# Altium integrated library all_in_one_library.IntLib: 677 symbols (part 2 of 3)
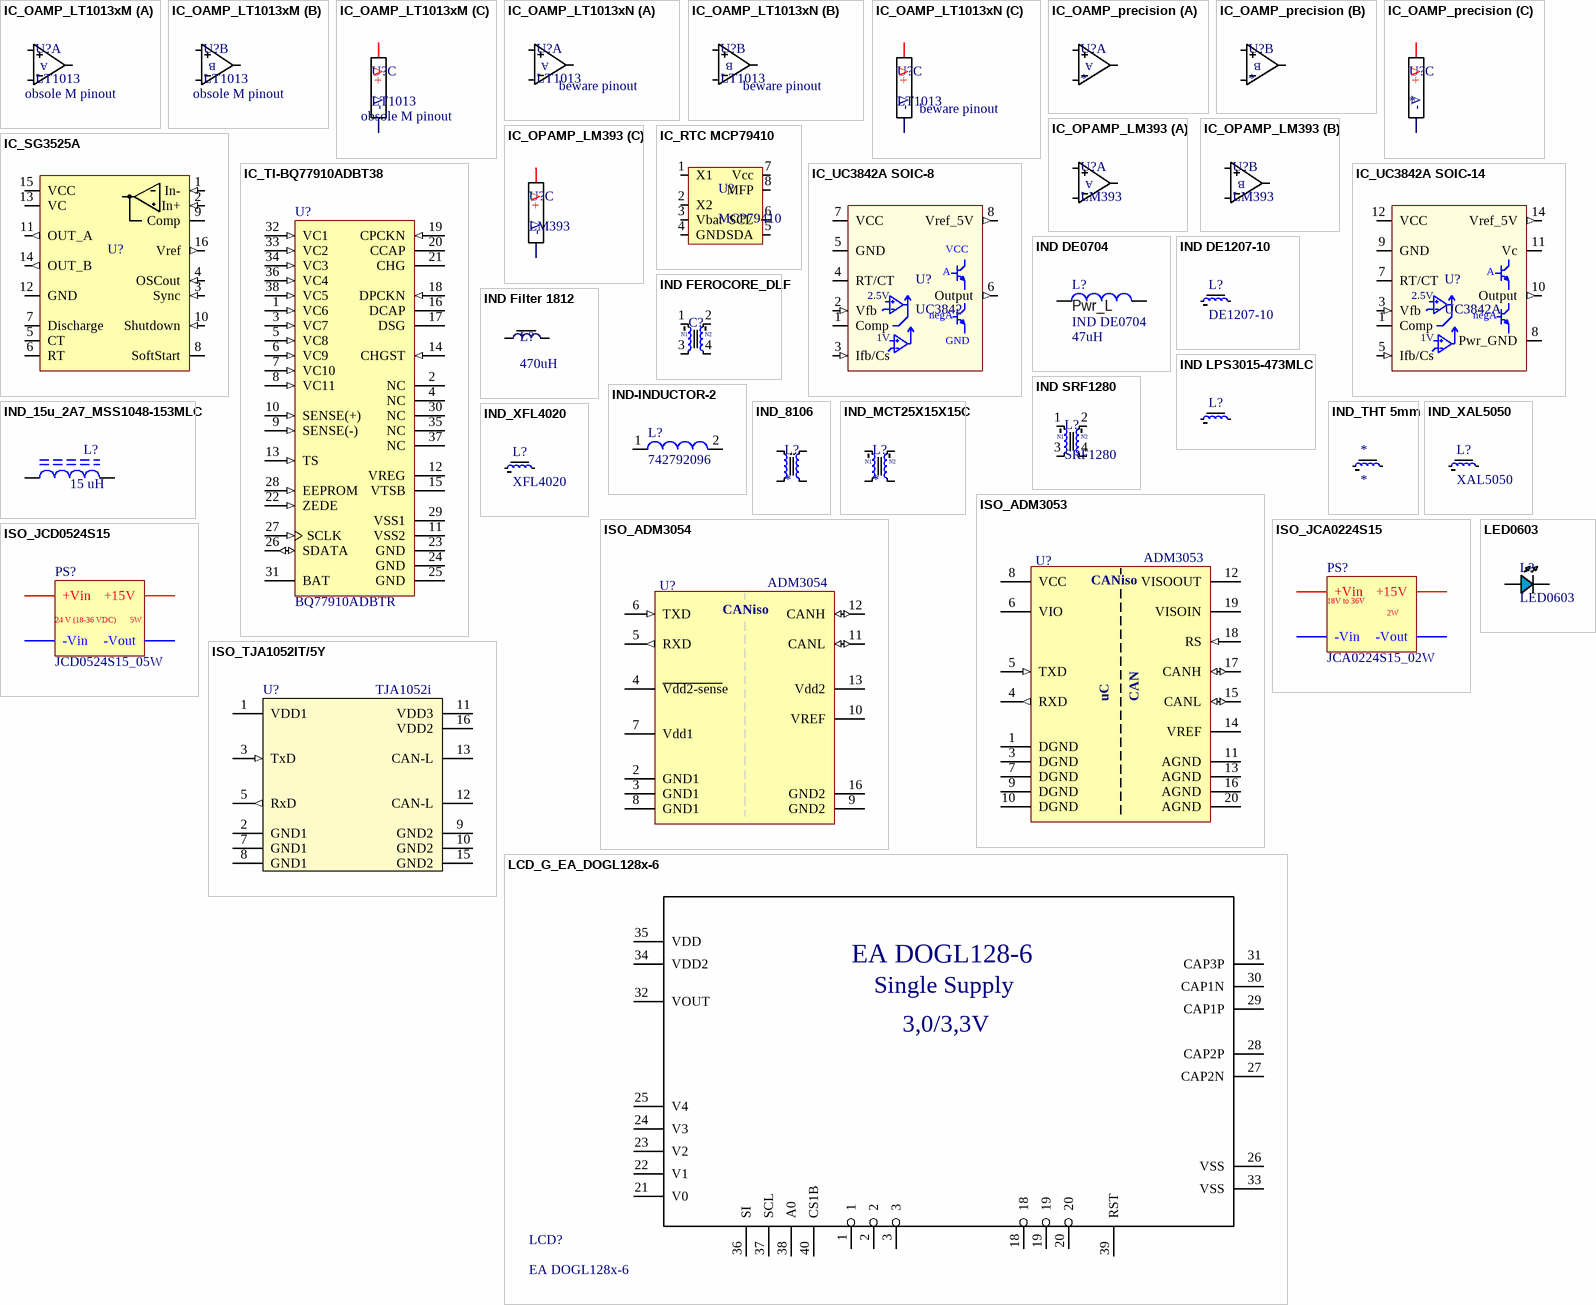
[diagram p18: symbols IC_OAMP_LT1013xM to LED0603]

## IND DE1207-10
designator L?, comment DE1207-10
Inductor: wire; 10uH; 6.7A; 0.019?; SMD; 12x12x8mm; �20%; -40A?85�C; Manufacturer: FERROCORE; Unit: pcs; SuppliedAmount: 500; MinAmount: 5; Multiples: 1; Inductance: 10�H; Supplier 1: TME; Manufacturer Part Number: DE1207-10; Category: smd power inductors; Stock 1: 1839; Pricing 1: 5=0,438, 25=0,373, 100=0,34, 250=0,289, 500=0,256 (USD); Weight: 4,893; Inductor type: wire; Operating current: 6.7A; Resistance: 0.019?; Mounting: SMD; Body dimensions: 12 x 12 x 8mm; Tolerance: �20%; Operating temperature: -40...85�C; ComponentLink1URL: http://www.tme.eu/en/details/de1207-10/smd-power-inductors/ferrocore/; ComponentLink1Description: http://www.tme.eu/en/details/de1207-10/smd-power-inductors/ferrocore/; Supplier Part Number 1: DE1207-10
footprint IND DE1207
pins: 1, 2

## IND FEROCORE_DLF
designator C?  (value not drawn)
footprint FEROCORE_DLF
pins: 1, 2, 3, 4
text: N1; N2

## IND Filter 1812
designator L?, comment 470uH
Filter 470uH - 10mH; Suplier: Farnell; Alias: 1812LS xx; Producer: Coilcraft; Link: http://cz.farnell.com/jsp/search/browse.jsp?N=224775+2007+110178564+110127172+110148617+110188935+110172601+110186245+110197766+110166166+110192877&No=0&getResults=true&appliedparametrics=true&locale=cs_CZ&divisionLocale=cs_CZ&catalogId=&skipManufacturer=false&skipParametricAttributeId=&prevNValues=224775+2007&mm=1001698|110127172|,&filtersHidden=false&appliedHidden=false&autoApply=false&originalQueryURL=%2Fjsp%2Fsearch%2Fbrowse.jsp%3FN%3D224775%2B2007%26No%3D0%26getResults%3Dtrue%26appliedparametrics%3Dtrue%26locale%3Dcs_CZ%26divisionLocale%3Dcs_CZ%26catalogId%3D%26skipManufacturer%3Dfalse%26skipParametricAttributeId%3D%26prevNValues%3D224775%2B2007
footprint IND_1812
pins: 1, 2

## IND LPS3015-473MLC
designator L?, comment LPS3015-473MLC  (value not drawn)
INDUCTOR, PWR, 47UH, 0.4A, 20%,17MHZ; Link: http://cz.farnell.com/coilcraft/lps3015-473mlc/inductor-pwr-47uh-0-4a-20-17mhz/dp/2287606
footprint COILCRAFT_LPS3015
pins: 1, 2

## IND SRF1280
designator L?, comment SRF1280
dual choke SRF1280; Suplier: Farnell; Alias: SRF1280; Datasheet: http://www.farnell.com/datasheets/1727960.pdf
footprint SRF1280
pins: 1, 2, 3, 4
text: N1; N2

## IND-INDUCTOR-2
designator L?, comment 742792096
SMD EMI Suppression Ferrite Bead WE-CBF, Z = 1000 Ohm; ComponentLink1URL: http://www.we-online.com; Impedance: 1000 Ohm; PackageDescription: Chip Inductor, 2-Leads, Body 2.0 x 1.2 mm; PackageReference: SMD-0805; ComponentLink1Description: Manufacturer Link; DatasheetVersion: Dec-2005; ComponentLink2Description: Datasheet; PackageVersion: 2005; ComponentLink2URL: http://www.we-online.de/katalog/media/pdf/742792096.pdf
footprint BEAD-0805
pins: 1, 2

## IND_15u_2A7_MSS1048-153MLC
designator L?, comment value 15 uH  (hidden comment: Inductor)
I_RMS@20°C rise: 3.51 A; I_SAT@20% drop: 3.06 A; R_DC: 0.0364 Ω; Tolerance: ±20%; SRF: 20 MHz; I_SAT@10% drop: 2.46 A; I_SAT@30% drop: 3.44 A; I_RMS@40°C rise: 4.26 A
footprint MSS1048_coilcraft (inductors)
pins: 1, 2
1 alternate drawing of the same symbol

## IND_8106
designator L?
dual choke 5mH 3.7A _8106; Alias: BOURNS JW MILLER - 8106-RC - CHOKE, 5MH, 3.7A
footprint 8106-RC (dual choke 5MH, 3.7A)
pins: 1, 2, 3, 4

## IND_MCT25X15X15C
designator L?
dual choke 5mH 6A MCT25X15X15C; Alias: MCT25X15X15C
footprint MCT25X15X15C
pins: 1, 2, 3, 4
text: N1; N2

## IND_THT 5mm
designator *
footprint Inductor 5mm
pins: 1, 2

## IND_XAL5050
designator L?, comment XAL5050
5.6u-47uH power ind by coilcraft; Link: http://cz.farnell.com/jsp/search/browse.jsp;jsessionid=5LXFQKZMXRVEYCQLCIRJOXQ?N=0&Ntk=gensearch&Ntt=XAL5050&Ntx=mode+matchallpartial&exposeLevel2Refinement=true&suggestions=false&ref=globalsearch&_requestid=82792
footprint IND_XAL5050
pins: 1, 2

## IND_XFL4020
designator L?, comment XFL4020
1u-4.7uH power ind by coilcraft; Link: http://cz.farnell.com/jsp/search/browse.jsp?N=2007+216045&Ntk=gensearch&Ntt=XFL4020&Ntx=mode+matchallpartial
footprint IND_XFL4020
pins: 1, 2

## ISO_ADM3053
designator U?, comment ADM3053
DCDC CAN Transciever
footprint SOIC20_W
pins: 1 DGND (power), 3 DGND (power), 4 RXD (out), 5 TXD (in), 6 VIO (power), 7 DGND (power), 8 VCC (power), 9 DGND (power), 10 DGND (power), 11 AGND (power), 12 VISOOUT (power), 13 AGND (power), 14 VREF (power), 15 CANL (io), 16 AGND (power), 17 CANH (io), 18 RS (in), 19 VISOIN (power), 20 AGND (power)
text: CANiso; uC; CAN

## ISO_ADM3054
designator U?, comment ADM3054
CAN Transciever ISO-5kV; link: http://cz.farnell.com/analog-devices/adm3054brwz/can-transceiver-1tx-rx-wsoic-16/dp/2377146; datasheet: http://www.analog.com/media/en/technical-documentation/data-sheets/ADM3054.pdf
footprint SOIC16_W
pins: 2 GND1 (power), 3 GND1 (power), 4 ~{Vdd2-sens}e (power), 5 RXD (out), 6 TXD (in), 7 Vdd1 (power), 8 GND1 (power), 9 GND2 (power), 10 VREF (power), 11 CANL (io), 12 CANH (io), 13 Vdd2 (power), 16 GND2 (power)
text: CANiso

## ISO_JCA0224S15
designator PS?, comment JCA0224S15_02W
XP POWER - JCA0224S15 - CONVERTER, DC/DC, 1O/P, 2W, 15V
footprint JCA0224S15
pins: +Vin (power), +Vout +15V (power), -Vin (power), -Vout (power)
text: 18V to 36V; 2W

## ISO_JCD0524S15
designator PS?, comment JCD0524S15_05W
XP POWER - JCD0524S15 - DC/DC CONVERTER, 5W, 15V, DIP-24
footprint JCD0524S15_05W
pins: +Vin (power), +Vout +15V (power), -Vin (power), -Vout (power)
text: 24 V (18-36 VDC); 5W

## ISO_TJA1052IT/5Y
designator U?, comment TJA1052i
can isolator 3.3-5V; link: http://cz.farnell.com/nxp/tja1052it-5y/can-transceiver-1tx-rx-soic-16/dp/2400552?ost=TJA1052i
footprint SOIC_16o
pins: 1 VDD1 (power), 2 GND1 (power), 3 TxD (in), 5 RxD (out), 7 GND1 (power), 8 GND1 (power), 9 GND2 (power), 10 GND2 (power), 11 VDD3 (power), 12 CAN-L, 13 CAN-L, 15 GND2 (power), 16 VDD2 (power)

## LCD_G_EA_DOGL128x-6
designator LCD?, comment EA DOGL128x-6
footprint LCDG_EA_DOGL128x-6
pins: 1 "(ARGB)", 2, 3, 18, 19, 20, 21 V0, 22 V1, 23 V2, 24 V3, 25 V4, 26 VSS, 27 CAP2N, 28 CAP2P, 29 CAP1P, 30 CAP1N, 31 CAP3P, 32 VOUT, 33 VSS, 34 VDD2, 35 VDD, 36 SI, 37 SCL, 38 A0, 39 RST, 40 CS1B
text: EA DOGL128-6; Single Supply; 3,0/3,3V

## LED0603
designator L?
footprint LED0603
pins: A, K

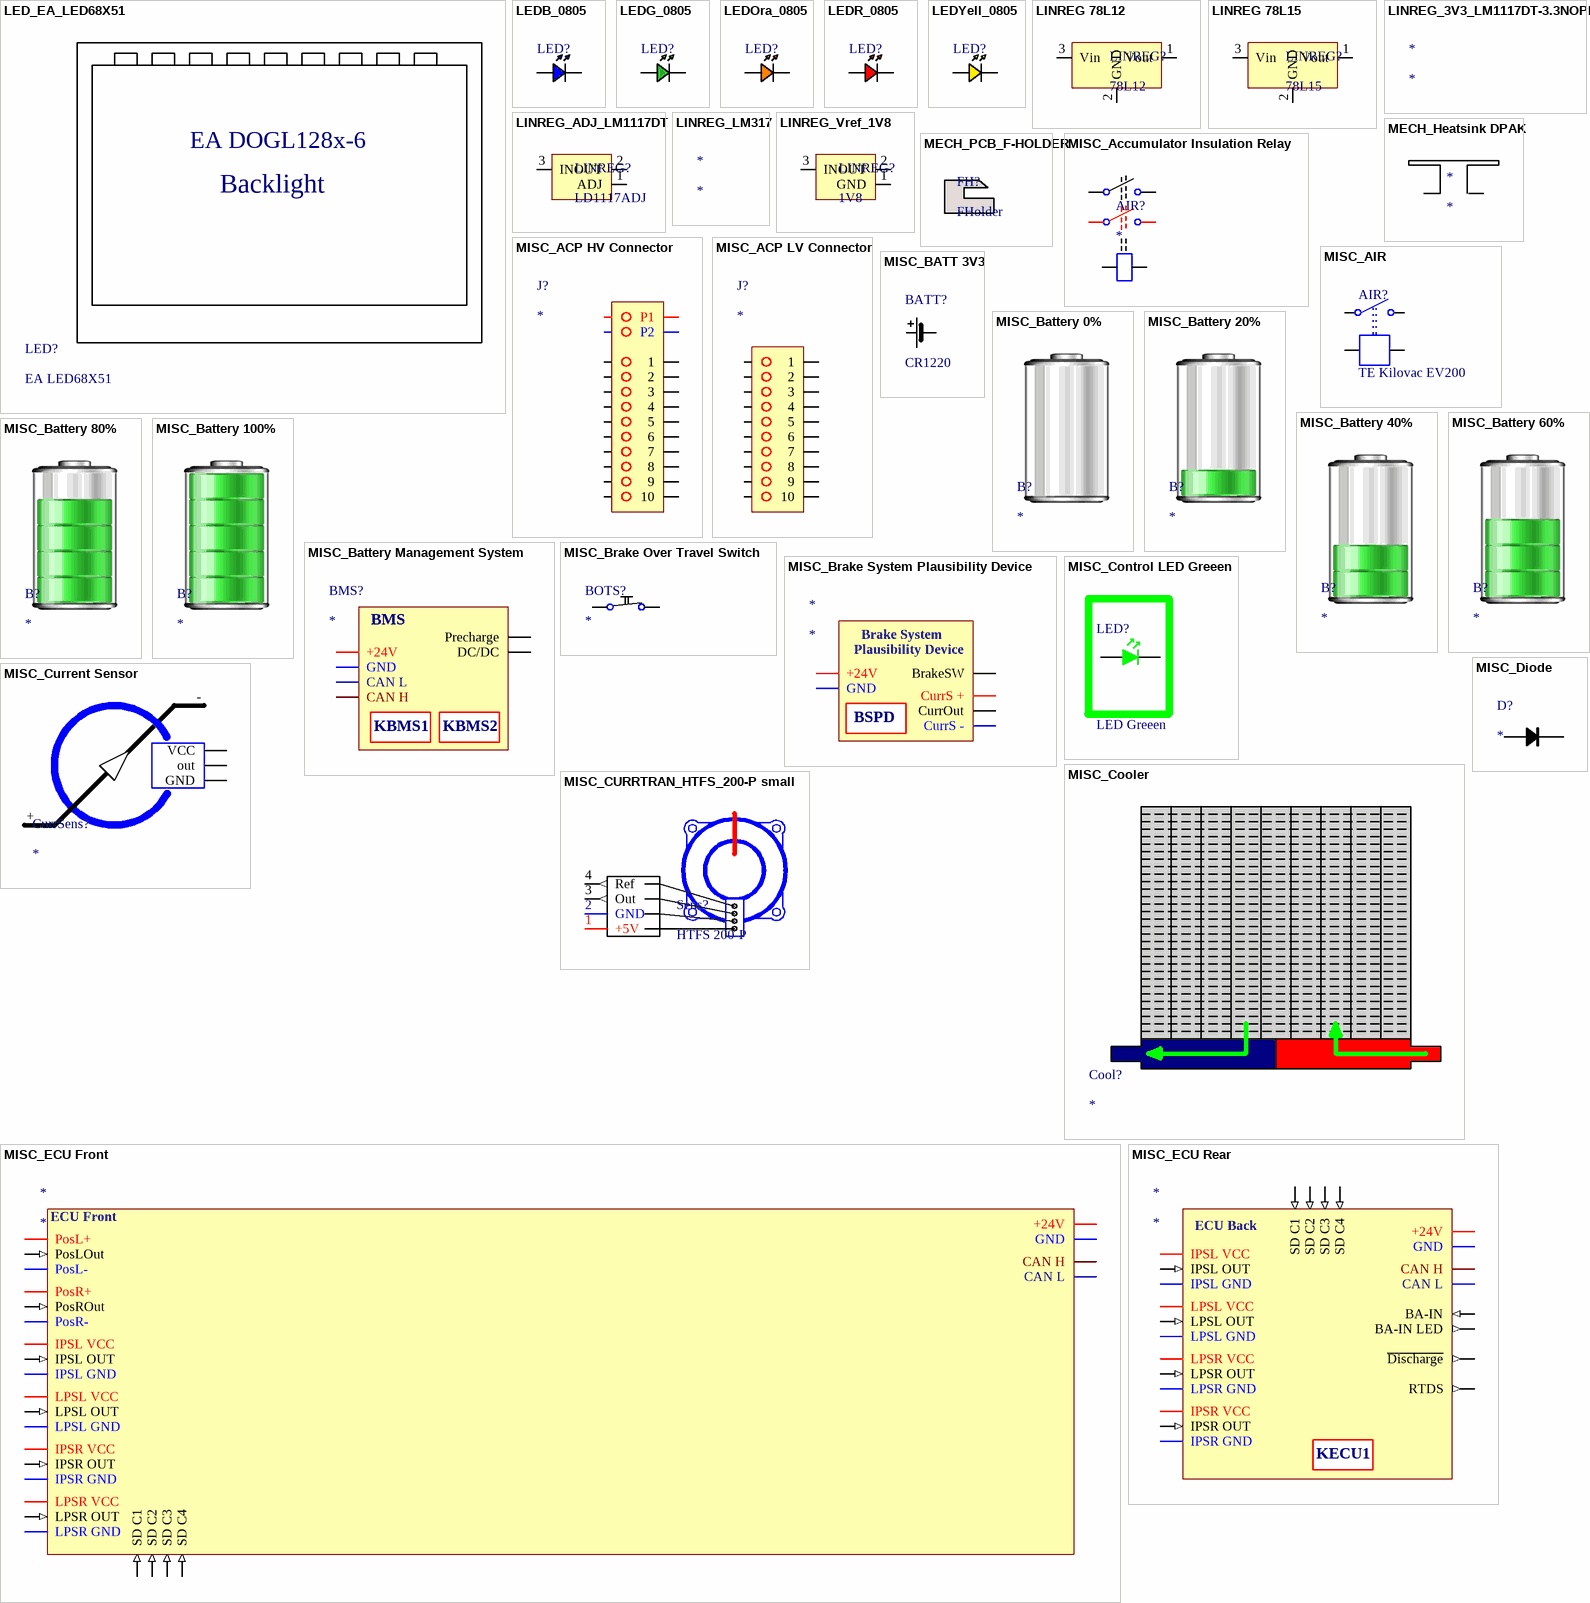
[diagram p6: symbols LED_EA_LED68X51 to MISC_ECU Rear]

## LED_EA_LED68X51
designator LED?, comment EA LED68X51
text: EA DOGL128x-6; Backlight

## LEDB_0805
designator LED?, comment blue  (value not drawn)
footprint 0805LEDB
pins: A, K

## LEDG_0805
designator LED?, comment green  (value not drawn)
footprint 0805LEDG
pins: A, K

## LEDOra_0805
designator LED?, comment orange  (value not drawn)
footprint 0805LEDOra
pins: A, K

## LEDR_0805
designator LED?, comment red  (value not drawn)
footprint 0805LEDR
pins: A, K

## LEDYell_0805
designator LED?, comment yellow  (value not drawn)
footprint 0805LEDYell
pins: A, K

## LINREG 78L12
designator LINREG?, comment 78L12
12V linear regulator
footprint TO92
pins: 1 Vout, 2 GND, 3 Vin

## LINREG 78L15
designator LINREG?, comment 78L15
15V linear regulator
footprint TO92
pins: 1 Vout, 2 GND, 3 Vin

## LINREG_3V3_LM1117DT-3.3NOPB
designator *

## LINREG_ADJ_LM1117DT
designator LINREG?, comment LD1117ADJ
15V 1A Adjustable low drop voltage regulator
footprint SOT223
footprint D-PAK
pins: 1 ADJ, 2 OUT, 3 IN

## LINREG_LM317
designator *

## LINREG_Vref_1V8
designator LINREG?, comment 1V8
1.8V Voltage reference; Alias: MCP1700; Suplier: Farnell
footprint SOT23m
pins: 1 GND, 2 OUT, 3 IN

## MECH_Heatsink DPAK
designator *
footprint DPAK_heatsink_SMD
pins: 0, 1

## MECH_PCB_F-HOLDER
designator FH?, comment FHolder
F-HOLDER_16-18-020; top-length: 16mm; bot-length: 18mm; width: 1mm
footprint FHOLDER1618020

## MISC_Accumulator Insulation Relay
designator AIR?
pins: 1, 2, 3, 4, 5, 6

## MISC_ACP HV Connector
designator J?
pins: 1, 1, 2, 2, 3, 3, 4, 4, 5, 5, 6, 6, 7, 7, 8, 8, 9, 9, 10, 10, P1, P1, P2, P2

## MISC_ACP LV Connector
designator J?
pins: 1, 1, 2, 2, 3, 3, 4, 4, 5, 5, 6, 6, 7, 7, 8, 8, 9, 9, 10, 10

## MISC_AIR
designator AIR?, comment TE Kilovac EV200
AIR
pins: 7, 8, A1 1, A2 10
1 alternate drawing of the same symbol

## MISC_BATT 3V3
designator BATT?, comment CR1220
footprint CR1220
pins: 1, 2

## MISC_Battery 0%
designator B?

## MISC_Battery 20%
designator B?

## MISC_Battery 40%
designator B?

## MISC_Battery 60%
designator B?

## MISC_Battery 80%
designator B?

## MISC_Battery 100%
designator B?

## MISC_Battery Management System
designator BMS?
pins: 10 +24V, 11 GND, 12 CAN L, 13 CAN H, 14 Precharge, 16 DC/DC
text: BMS; KBMS1; KBMS2

## MISC_Brake Over Travel Switch
designator BOTS?
pins: 4, 5
1 alternate drawing of the same symbol

## MISC_Brake System Plausibility Device
designator *
pins: +24V, BrakeSW, CurrOut, CurrS +, CurrS -, GND
text: Brake System; Plausibility Device; BSPD

## MISC_Control LED Greeen
designator LED?, comment LED Greeen
pins: 1 LED1, 2 LED2

## MISC_Cooler
designator Cool?
Cooler

## MISC_Current Sensor
designator CurrSens?
pins: +, -, GND, out, VCC

## MISC_CURRTRAN_HTFS_200-P small
designator Sens?, comment HTFS 200-P
footprint CURRTRAN_LEM_HTFS
pins: 1 +5V (power), 2 GND (power), 3 Out (out), 4 Ref (out)
1 alternate drawing of the same symbol

## MISC_Diode
designator D?
pins: A, K

## MISC_ECU Front
designator *
pins: 1 PosL+, 2 PosLOut (in), 3 PosL-, 4 PosR+, 5 PosROut (in), 6 PosR-, 12 CAN L, 13 CAN H, +24V, GND, IPSL GND, IPSL OUT (in), IPSL VCC, IPSR GND, IPSR OUT (in), IPSR VCC, LPSL GND, LPSL OUT (in), LPSL VCC, LPSR GND, LPSR OUT (in), LPSR VCC, SD C1 (in), SD C2 (in), SD C3 (in), SD C4 (in)
text: ECU Front

## MISC_ECU Rear
designator *
pins: 12 CAN L, 13 CAN H, +24V, BA-IN (in), BA-IN LED (out), Discharge ~{Discharge} (out), GND, IPSL GND, IPSL OUT (in), IPSL VCC, IPSR GND, IPSR OUT (in), IPSR VCC, LPSL GND, LPSL OUT (in), LPSL VCC, LPSR GND, LPSR OUT (in), LPSR VCC, RTDS (out), SD C1 (in), SD C2 (in), SD C3 (in), SD C4 (in)
text: ECU Back; KECU1

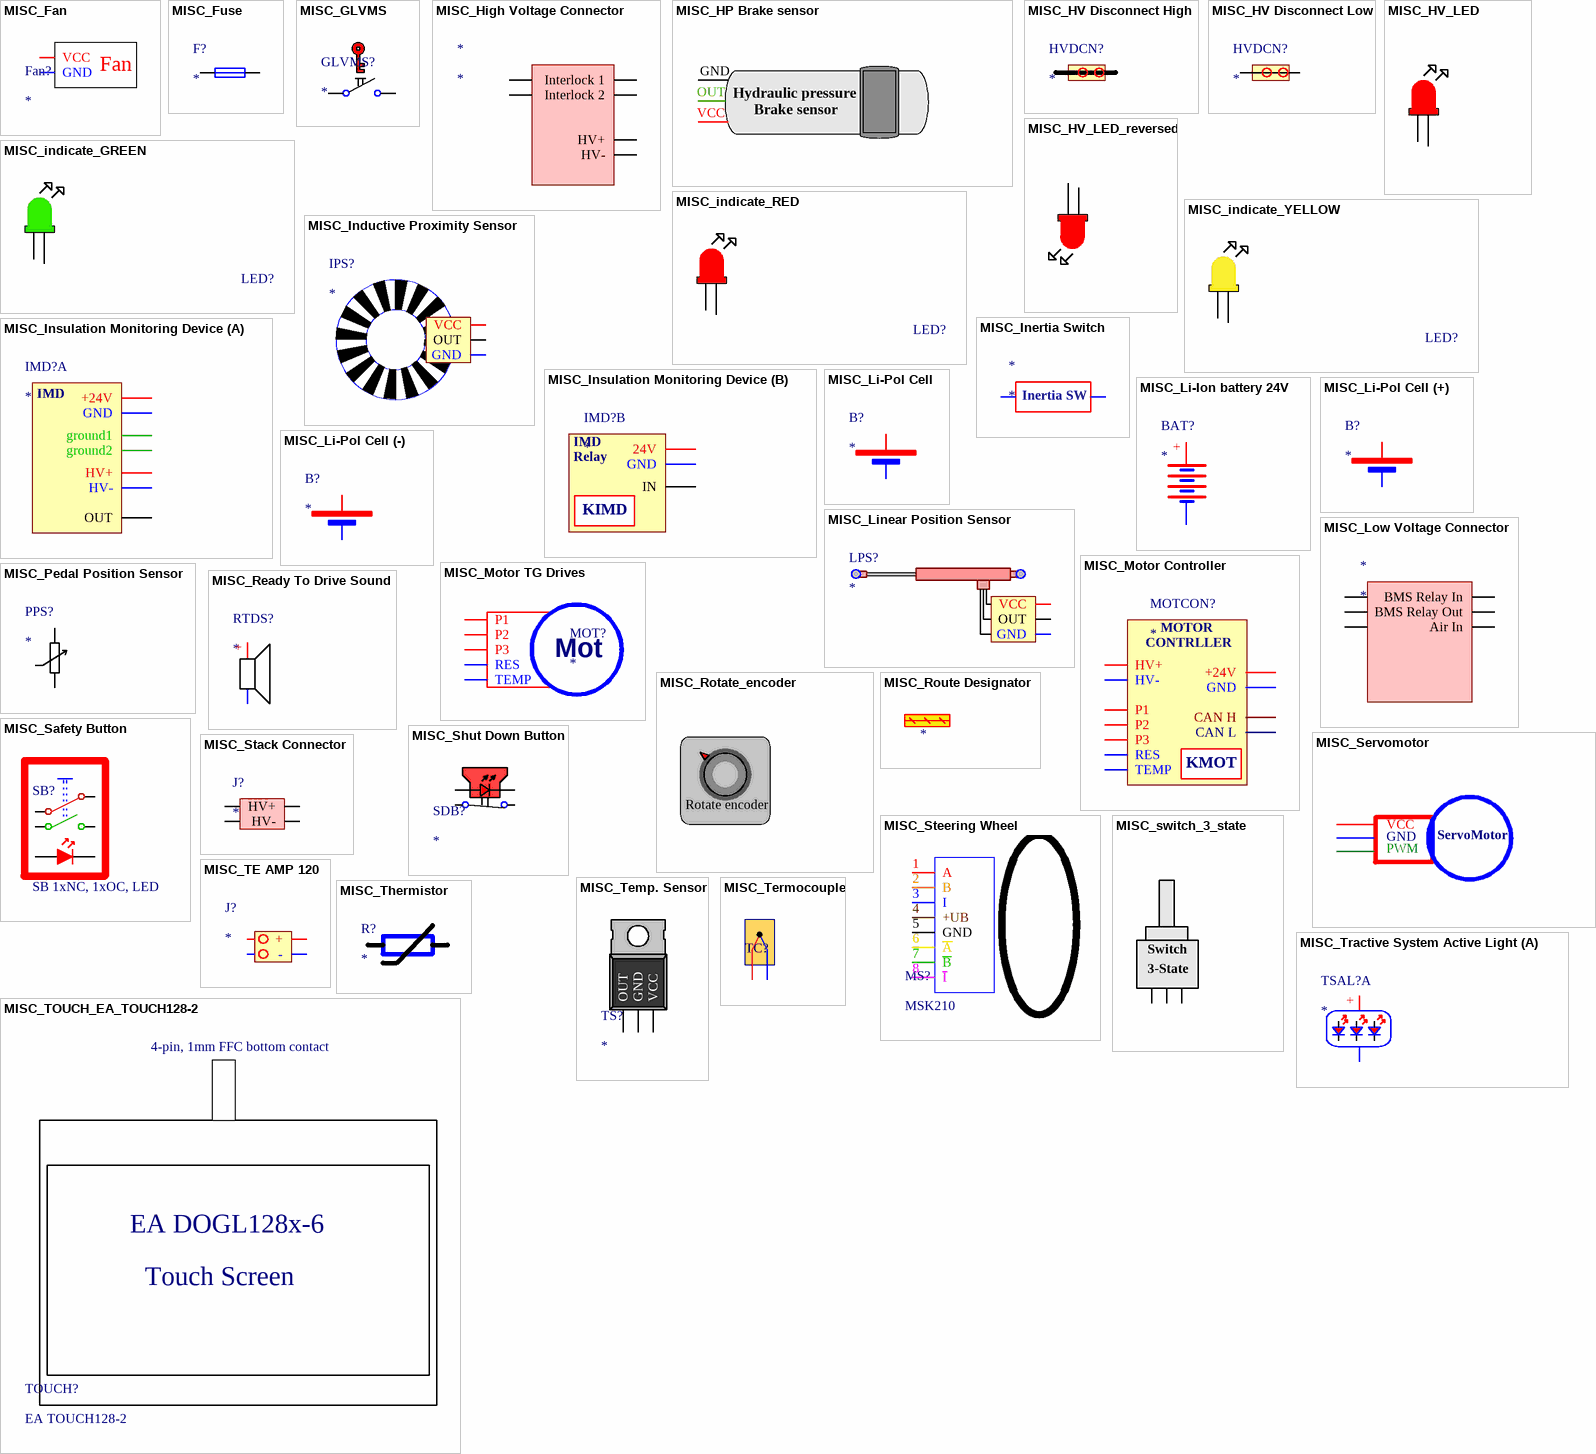
[diagram p7: symbols MISC_Fan to MISC_Tractive System Active Light]

## MISC_Fan
designator Fan?
Ventilátor
pins: 1 GND, 2 VCC
1 alternate drawing of the same symbol
text: Fan

## MISC_Fuse
designator F?
pins: 1, 2

## MISC_GLVMS
designator GLVMS?
Grounded Low Voltage Master Switch
pins: 4, 5
1 alternate drawing of the same symbol

## MISC_High Voltage Connector
designator *
pins: HV+, HV- Interlock 1, HV- Interlock 2, HV-, HV- Interlock 2, HV- Interlock 3

## MISC_HP Brake sensor
designator HP Brake sensor
Hydralic pressure sensor
pins: +, -, OUT
text: GND; Hydraulic pressure; Brake sensor; VCC

## MISC_HV Disconnect High
designator HVDCN?
pins: 1, 2

## MISC_HV Disconnect Low
designator HVDCN?
pins: 1, 2

## MISC_HV_LED
designator HV_LED?  (value not drawn)
High Voltage LED indicate
pins: 0, 1
1 alternate drawing of the same symbol

## MISC_HV_LED_reversed
designator HV_LED?  (value not drawn)
High Voltage LED indicate
pins: 0, 1
1 alternate drawing of the same symbol

## MISC_indicate_GREEN
designator LED?  (value not drawn)
LED indicate
pins: 0, 1
1 alternate drawing of the same symbol

## MISC_indicate_RED
designator LED?  (value not drawn)
LED indicate
pins: 0, 1
1 alternate drawing of the same symbol

## MISC_indicate_YELLOW
designator LED?  (value not drawn)
LED indicate
pins: 0, 1
1 alternate drawing of the same symbol

## MISC_Inductive Proximity Sensor
designator IPS?
pins: GND, OUT, VCC

## MISC_Inertia Switch
designator *
pins: 1, 2
1 alternate drawing of the same symbol
text: Inertia SW

## MISC_Insulation Monitoring Device
designator IMD?
part A pins: +24V, GND, ground1, ground2, HV+, HV-, OUT
part B pins: 24V, GND, IN
part A text: IMD
part B text: IMD; Relay; KIMD

## MISC_Li-Ion battery 24V
designator BAT?
pins: + 1, -

## MISC_Li-Pol Cell
designator B?
footprint Cell Kokam 11Ah (1)
pins: +, -

## MISC_Li-Pol Cell (+)
designator B?
footprint Cell Kokam 11Ah (+)
pins: +

## MISC_Li-Pol Cell (-)
designator B?
footprint Cell Kokam 11Ah (-)
pins: -

## MISC_Linear Position Sensor
designator LPS?
pins: GND, OUT, VCC
1 alternate drawing of the same symbol

## MISC_Low Voltage Connector
designator *
pins: Air In, Air In, HV- BMS Relay In, HV- BMS Relay Out, HV- Interlock 2, HV- Interlock 3

## MISC_Motor Controller
designator MOTCON?
pins: 14 +24V, 15 GND, 16 CAN H, 17 CAN L, HV+, HV-, P1, P2, P3, RES, TEMP
text: MOTOR; CONTRLLER; KMOT

## MISC_Motor TG Drives
designator MOT?
pins: P1, P2, P3, RES, TEMP
text: Mot

## MISC_Pedal Position Sensor
designator PPS?
pins: 1, 2, 3

## MISC_Ready To Drive Sound
designator RTDS?
pins: 7, +
1 alternate drawing of the same symbol

## MISC_Rotate_encoder
designator SW_Enc?
Rotate encoder
1 alternate drawing of the same symbol

## MISC_Route Designator
designator Route_?  (graphical)
Route description; Cross-section area: * mm2; Current rating: * A; Voltage rating: LV/HV; Shielding: Y/N; Contained wires: *; Length: * mm; Layer: *

## MISC_Safety Button
designator SB?, comment SB 1xNC, 1xOC, LED
Safety Button
pins: 1 NC1, 2 NC2, 3 NO1, 4 NO2, 5 LED1, 6 LED2

## MISC_Servomotor
designator ServoMotor?
pins: 1 VCC, 2 GND, 3 PWM
1 alternate drawing of the same symbol
text: ServoMotor

## MISC_Shut Down Button
designator SDB?
pins: 4, 5, A, K
1 alternate drawing of the same symbol

## MISC_Stack Connector
designator J?
pins: HV+, HV+, HV-, HV-

## MISC_Steering Wheel
designator MS?, comment MSK210
magnetic sensor
pins: 1 A, 2 B, 3 I, 4 +UB, 5 GND, 6 ~{A}, 7 ~{B}, 8 ~{I}
1 alternate drawing of the same symbol

## MISC_switch_3_state
designator SW_3S_?
3-state switch
pins: 0, 1, 2
1 alternate drawing of the same symbol
text: Switch; 3-State

## MISC_TE AMP 120
designator J?
TE AMP Power Series 120
pins: +, +, -, -

## MISC_Temp. Sensor
designator TS?
Temperature Sensor SMT160-30
pins: 3 VCC, 4 GND, 5 OUT

## MISC_Termocouple
designator TC?  (value not drawn)
TC-K
pins: 1 TCK1, 2 TCK2

## MISC_Thermistor
designator R?
pins: 1, 2

## MISC_TOUCH_EA_TOUCH128-2
designator TOUCH?, comment EA TOUCH128-2  (mechanical)
text: 4-pin, 1mm FFC bottom contact; EA DOGL128x-6; Touch Screen

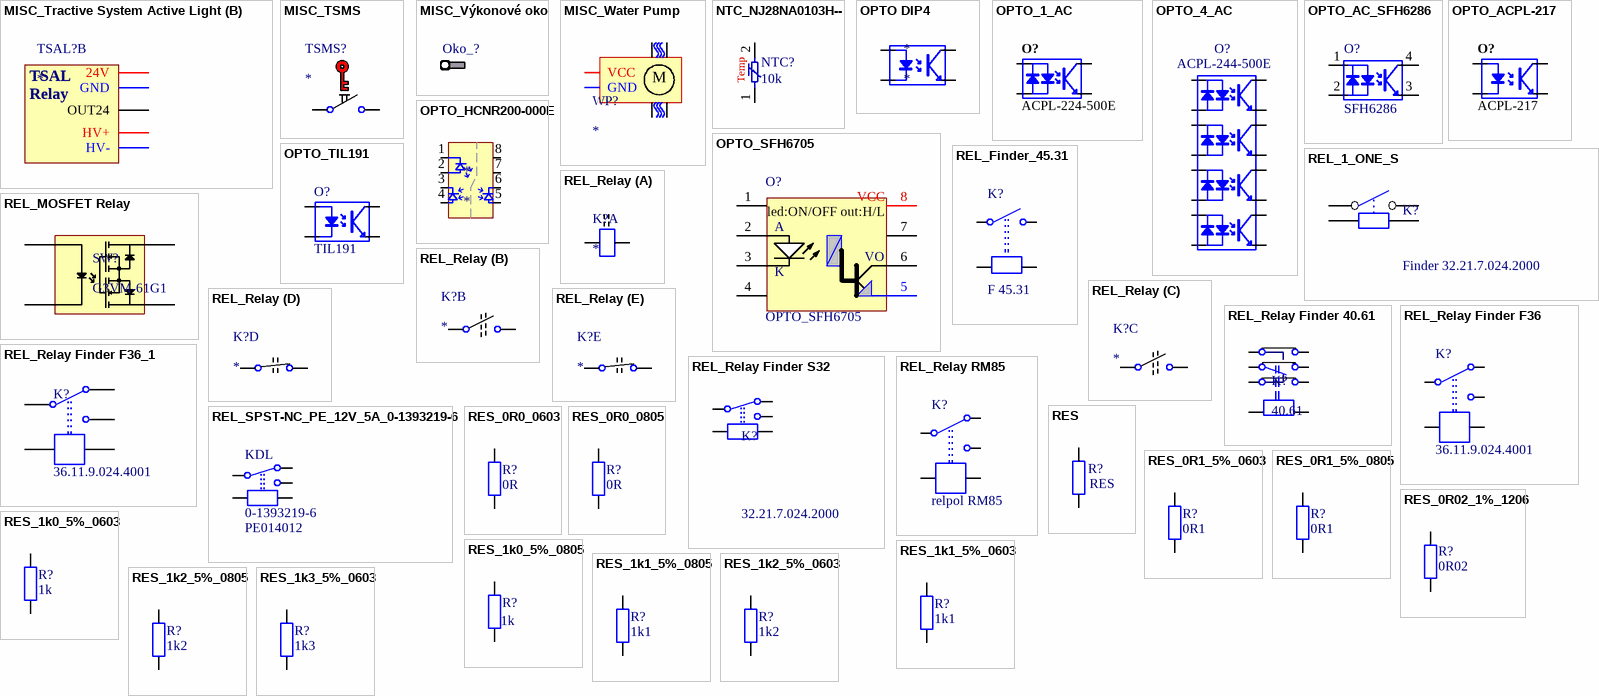
[diagram p8: symbols MISC_Tractive System Active Light to RES_1k3_5%_0603]

## MISC_Tractive System Active Light
designator TSAL?
part A pins: 9, +
part B pins: 24V, GND, HV+, HV-, OUT24
1 alternate drawing of the same symbol
part B text: TSAL; Relay

## MISC_TSMS
designator TSMS?
Tractive System Master Switch
pins: 4, 5
1 alternate drawing of the same symbol

## MISC_Výkonové oko
designator Oko_?  (value not drawn)
Výkonové oko trubkové krimpovací; Wire cross-section: mm2; Mounting diameter: mm

## MISC_Water Pump
designator WP?
Water Pump
pins: 1 GND, 2 VCC
1 alternate drawing of the same symbol
text: M

## NTC_NJ28NA0103H--
designator NTC?, comment 10k
NTC termistor 10k NJ28NA0103H
footprint NTC_SMD
pins: 1, 2
text: Temp

## OPTO DIP4
designator *
footprint DIP4 (optocouplers)
pins: 1 A, 2 K, 3 E, 4 C

## OPTO_1_AC
designator O?, comment ACPL-224-500E
optoclen
footprint SO4
pins: 1 A, 2 K, 3 E, 4 C

## OPTO_4_AC
designator O?, comment ACPL-244-500E
optoclen
footprint so16
pins: 1 A, 2 K, 3 A, 4 K, 5 A, 6 K, 7 A, 8 K, 9 E, 10 C, 11 E, 12 C, 13 E, 14 C, 15 E, 16 C

## OPTO_AC_SFH6286
designator O?, comment SFH6286
pins: 1 A, 2 K, 3 E, 4 C

## OPTO_ACPL-217
designator O?, comment ACPL-217
optoclen; Alias: ACPL-217
footprint SO4
pins: 1 A, 2 K, 3 E, 4 C

## OPTO_HCNR200-000E
designator *
Optocoupler
footprint DIP8
footprint DIP8opto (optocouplers _ wider then DIP8)
pins: 1 LED Cathode, 2 LED Anode, 3 PD1 Cathode, 4 PD Anode, 5 PD2 Anode, 6 PD2 Cathode, 7 NC, 8 NC

## OPTO_SFH6705
designator O?
high CMR, high speed optocoupler
footprint DIP-8
footprint DIP-8_P
footprint DIP 8 (Footprint not found)
footprint DIP8opto (optocouplers _ wider then DIP8)
footprint DIP 8
pins: 1 NC, 2 ANODE, 3 CATHODE, 4 NC, 5 GND, 6 VO, 7 NC, 8 VCC
text: led:ON/OFF out:H/L; A; K

## OPTO_TIL191
designator O?, comment TIL191
optoclen
footprint DIP4 (optocouplers)
pins: 1 A, 2 K, 3 E, 4 C

## REL_1_ONE_S
designator K?, comment Finder 32.21.7.024.2000
REL 10A
footprint REL_6A_32.21.7
pins: 1, 2, 3, 4

## REL_Finder_45.31
designator K?, comment F 45.31
16/30A 250/400V  24Vcoil Finder 45.31; Link: http://docs-europe.electrocomponents.com/webdocs/107f/0900766b8107ff39.pdf
footprint REL_Finder_45.31
pins: 11, 14, A1, A2

## REL_MOSFET Relay
designator SW?, comment G3VM-61G1
MOSFET Relay G3VM-61G1
footprint SOP4
pins: 1, 2, 3, 4

## REL_Relay
designator K?
part A pins: 2, 3
part B pins: 4, 5
part C pins: 4, 5
part D pins: 4, 5
part E pins: 4, 5

## REL_Relay Finder 40.61
designator K?, comment 40.61
40 series 16A 400VAC finder relay; Datasheet: http://gfinder.findernet.com//assets/Series/353/S40EN.pdf
footprint REL_16A_F40.61
pins: 11, 12, 14, 21, 22, 24, A1, A2

## REL_Relay Finder F36
designator K?, comment 36.11.9.024.4001
Relay Finder F36 series, 10A 250VAC
footprint Relay F36
pins: 11, 12, 14, A1, A2

## REL_Relay Finder F36_1
designator K?, comment 36.11.9.024.4001
Relay Finder F36 series, 10A 250VAC
pins: 7, 8, 8, A1 1, A2 10

## REL_Relay Finder S32
designator K?, comment 32.21.7.024.2000
Relay Finder S32 series, 6A 250VAC
pins: 7, 8, 8, A1 1, A2 10

## REL_Relay RM85
designator K?, comment relpol RM85
Relay 16A/250V AC, 16A/24V DC
footprint Relay RM85
pins: 11, 12, 14, A1, A2

## REL_SPST-NC_PE_12V_5A_0-1393219-6
designator KDL, comment 0-1393219-6  Supplier Part Number 1: PE014012
Relay PE014012; Supplier 1: TME
footprint RELAY_PE_NC
pins: 11, 12, 14, A1, A2

## RES
designator R?
Resistor
footprint RES_0805
footprint RES_0603
pins: 1, 2
1 alternate drawing of the same symbol

## RES_0R0_0603
designator R?, comment 0R
0.00; Tolerance [%]: None; Power Rating [W]: 0.1; Case [EIA]: 0603; Case [Metric]: 1608; Value [Ω]: 0.00; Value: 0R
footprint RES_0603
pins: 1, 2
1 alternate drawing of the same symbol

## RES_0R0_0805
designator R?, comment 0R
0.00; Tolerance [%]: None; Power Rating [W]: 0.1; Case [EIA]: 0805; Case [Metric]: 2012; Value [Ω]: 0.00; Value: 0R
footprint RES_0805
pins: 1, 2
1 alternate drawing of the same symbol

## RES_0R1_5%_0603
designator R?, comment value 0R1  (hidden comment: Thick film)
0.10; Tolerance [%]: ±5; Power Rating [W]: 0.1; Case [EIA]: 0603; Case [Metric]: 1608; Value [Ω]: 0.10
footprint RES_0603
pins: 1, 2
1 alternate drawing of the same symbol

## RES_0R1_5%_0805
designator R?, comment value 0R1  (hidden comment: Thick film)
0.10; Tolerance [%]: ±5; Power Rating [W]: 0.1; Case [EIA]: 0805; Case [Metric]: 2012; Value [Ω]: 0.10
footprint RES_0805
pins: 1, 2
1 alternate drawing of the same symbol

## RES_0R02_1%_1206
designator R?, comment 0R02
0.02
footprint RES_1206
pins: 1, 2

## RES_1k0_5%_0603
designator R?, comment value 1k  (hidden comment: Thick film)
1000.00; Tolerance [%]: ±5; Power Rating [W]: 0.1; Case [EIA]: 0603; Case [Metric]: 1608; Value [Ω]: 1000.00
footprint RES_0603
pins: 1, 2
1 alternate drawing of the same symbol

## RES_1k0_5%_0805
designator R?, comment value 1k  (hidden comment: Thick film)
1000.00; Tolerance [%]: ±5; Power Rating [W]: 0.1; Case [EIA]: 0805; Case [Metric]: 2012; Value [Ω]: 1000.00
footprint RES_0805
pins: 1, 2
1 alternate drawing of the same symbol

## RES_1k1_5%_0603
designator R?, comment value 1k1  (hidden comment: Thick film)
1100.00; Tolerance [%]: ±5; Power Rating [W]: 0.1; Case [EIA]: 0603; Case [Metric]: 1608; Value [Ω]: 1100.00
footprint RES_0603
pins: 1, 2
1 alternate drawing of the same symbol

## RES_1k1_5%_0805
designator R?, comment value 1k1  (hidden comment: Thick film)
1100.00; Tolerance [%]: ±5; Power Rating [W]: 0.1; Case [EIA]: 0805; Case [Metric]: 2012; Value [Ω]: 1100.00
footprint RES_0805
pins: 1, 2
1 alternate drawing of the same symbol

## RES_1k2_5%_0603
designator R?, comment value 1k2  (hidden comment: Thick film)
1200.00; Tolerance [%]: ±5; Power Rating [W]: 0.1; Case [EIA]: 0603; Case [Metric]: 1608; Value [Ω]: 1200.00
footprint RES_0603
pins: 1, 2
1 alternate drawing of the same symbol

## RES_1k2_5%_0805
designator R?, comment value 1k2  (hidden comment: Thick film)
1200.00; Tolerance [%]: ±5; Power Rating [W]: 0.1; Case [EIA]: 0805; Case [Metric]: 2012; Value [Ω]: 1200.00
footprint RES_0805
pins: 1, 2
1 alternate drawing of the same symbol

## RES_1k3_5%_0603
designator R?, comment value 1k3  (hidden comment: Thick film)
1300.00; Tolerance [%]: ±5; Power Rating [W]: 0.1; Case [EIA]: 0603; Case [Metric]: 1608; Value [Ω]: 1300.00
footprint RES_0603
pins: 1, 2
1 alternate drawing of the same symbol

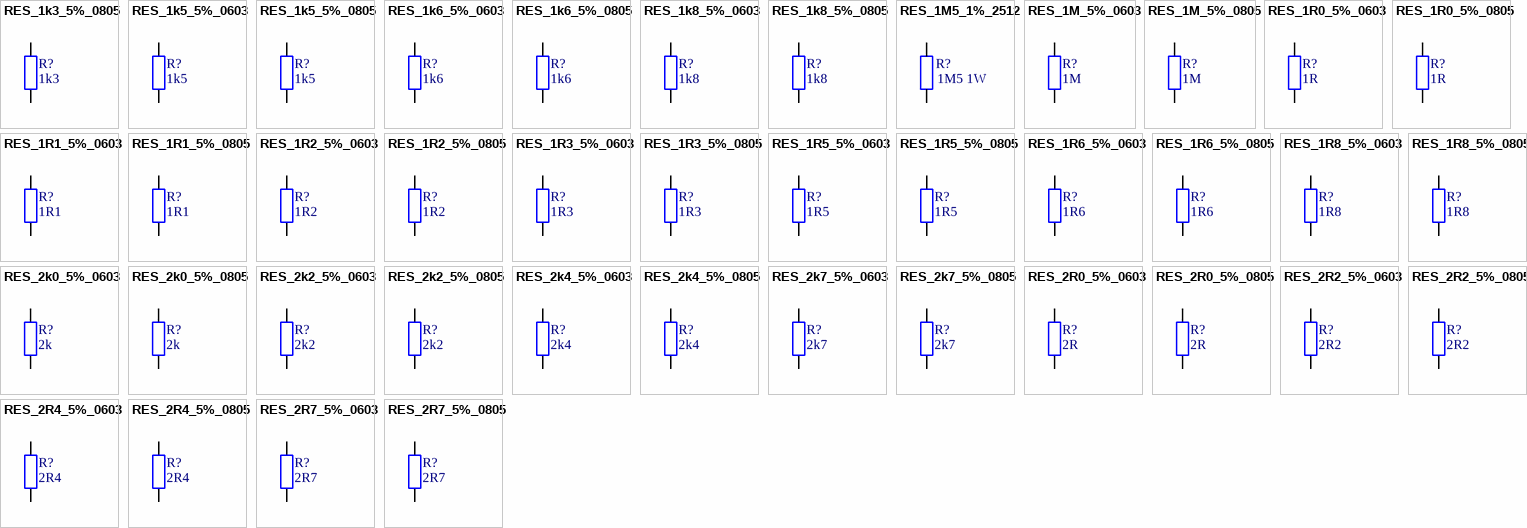
[diagram p9: symbols RES_1k3_5%_0805 to RES_2R7_5%_0805]

## RES_1k3_5%_0805
designator R?, comment value 1k3  (hidden comment: Thick film)
1300.00; Tolerance [%]: ±5; Power Rating [W]: 0.1; Case [EIA]: 0805; Case [Metric]: 2012; Value [Ω]: 1300.00
footprint RES_0805
pins: 1, 2
1 alternate drawing of the same symbol

## RES_1k5_5%_0603
designator R?, comment value 1k5  (hidden comment: Thick film)
1500.00; Tolerance [%]: ±5; Power Rating [W]: 0.1; Case [EIA]: 0603; Case [Metric]: 1608; Value [Ω]: 1500.00
footprint RES_0603
pins: 1, 2
1 alternate drawing of the same symbol
